# Altium footprint library Connector_PinHeader_2.00mm.PcbLib: 278 footprints (part 14 of 18) (continued)
## PinHeader_2x20_P2.00mm_Horizontal [mm] (continued)
  text "'.Designator'" at 5.006,-22.642 h0.9

## PinHeader_2x20_P2.00mm_Vertical [mm]
pads (40):
  rect 1.35x1.35 hole 0.8: 1(0,0)
  rrect100% 1.35x1.35 hole 0.8: 2(2,0) 3(0,-2) 4(2,-2) 5(0,-4) 6(2,-4) 7(0,-6) 8(2,-6) 9(0,-8) 10(2,-8) 11(0,-10) 12(2,-10) 13(0,-12) 14(2,-12) 15(0,-14) 16(2,-14) 17(0,-16) 18(2,-16) 19(0,-18) 20(2,-18) 21(0,-20) 22(2,-20) 23(0,-22) 24(2,-22) 25(0,-24) 26(2,-24) 27(0,-26) 28(2,-26) 29(0,-28) 30(2,-28) 31(0,-30) 32(2,-30) 33(0,-32) 34(2,-32) 35(0,-34) 36(2,-34) 37(0,-36) 38(2,-36) 39(0,-38) 40(2,-38)
F.SilkS:
  lines w0.12: -1.06,0 -1.06,1.06 0,1.06 ; -1.06,-39.06 3.06,-39.06 3.06,1.06 1,1.06 1,-1 -1.06,-1 -1.06,-39.06
F.CrtYd:
  lines w0.05: -1.5,-39.5 -1.5,1.5 3.5,1.5 3.5,-39.5 -1.5,-39.5
F.Fab:
  lines w0.1: -1,-39 -1,0 0,1 3,1 3,-39 -1,-39
  text "'.Designator'" at 1.84,-23.047 h1

## PinHeader_2x20_P2.00mm_Vertical_SMD [mm]
pads (40):
  rect 2.58x1 smd: 1(-2.085,19) 2(2.085,19) 3(-2.085,17) 4(2.085,17) 5(-2.085,15) 6(2.085,15) 7(-2.085,13) 8(2.085,13) 9(-2.085,11) 10(2.085,11) 11(-2.085,9) 12(2.085,9) 13(-2.085,7) 14(2.085,7) 15(-2.085,5) 16(2.085,5) 17(-2.085,3) 18(2.085,3) 19(-2.085,1) 20(2.085,1) 21(-2.085,-1) 22(2.085,-1) 23(-2.085,-3) 24(2.085,-3) 25(-2.085,-5) 26(2.085,-5) 27(-2.085,-7) 28(2.085,-7) 29(-2.085,-9) 30(2.085,-9) 31(-2.085,-11) 32(2.085,-11) 33(-2.085,-13) 34(2.085,-13) 35(-2.085,-15) 36(2.085,-15) 37(-2.085,-17) 38(2.085,-17) 39(-2.085,-19) 40(2.085,-19)
F.SilkS:
  lines w0.12: -3.315,19.76 -2.06,19.76 -2.06,20.06 2.06,20.06 2.06,19.76 ; -2.06,-19.76 -2.06,-20.06 2.06,-20.06 2.06,-19.76 ; -2.06,-18.24 -2.06,-17.76 ; -2.06,-16.24 -2.06,-15.76 ; -2.06,-14.24 -2.06,-13.76 ; -2.06,-12.24 -2.06,-11.76 ; -2.06,-10.24 -2.06,-9.76 ; -2.06,-8.24 -2.06,-7.76 ; -2.06,-6.24 -2.06,-5.76 ; -2.06,-4.24 -2.06,-3.76 ; -2.06,-2.24 -2.06,-1.76 ; -2.06,-0.24 -2.06,0.24 ; -2.06,1.76 -2.06,2.24 ; -2.06,3.76 -2.06,4.24 ; -2.06,5.76 -2.06,6.24 ; -2.06,7.76 -2.06,8.24 ; -2.06,9.76 -2.06,10.24 ; -2.06,11.76 -2.06,12.24 ; -2.06,13.76 -2.06,14.24 ; -2.06,15.76 -2.06,16.24 ; -2.06,17.76 -2.06,18.24 ; 2.06,-18.24 2.06,-17.76 ; 2.06,-16.24 2.06,-15.76 ; 2.06,-14.24 2.06,-13.76 ; 2.06,-12.24 2.06,-11.76 ; 2.06,-10.24 2.06,-9.76 ; 2.06,-8.24 2.06,-7.76 ; 2.06,-6.24 2.06,-5.76 ; 2.06,-4.24 2.06,-3.76 ; 2.06,-2.24 2.06,-1.76 ; 2.06,-0.24 2.06,0.24 ; 2.06,1.76 2.06,2.24 ; 2.06,3.76 2.06,4.24 ; 2.06,5.76 2.06,6.24 ; 2.06,7.76 2.06,8.24 ; 2.06,9.76 2.06,10.24 ; 2.06,11.76 2.06,12.24 ; 2.06,13.76 2.06,14.24 ; 2.06,15.76 2.06,16.24 ; 2.06,17.76 2.06,18.24
F.CrtYd:
  lines w0.05: -4.9,-20.5 -4.9,20.5 4.9,20.5 4.9,-20.5 -4.9,-20.5
F.Fab:
  lines w0.1: -2,-19.25 -2.875,-19.25 -2.875,-18.75 -2,-18.75 ; -2,-17.25 -2.875,-17.25 -2.875,-16.75 -2,-16.75 ; -2,-15.25 -2.875,-15.25 -2.875,-14.75 -2,-14.75 ; -2,-13.25 -2.875,-13.25 -2.875,-12.75 -2,-12.75 ; -2,-11.25 -2.875,-11.25 -2.875,-10.75 -2,-10.75 ; -2,-9.25 -2.875,-9.25 -2.875,-8.75 -2,-8.75 ; -2,-7.25 -2.875,-7.25 -2.875,-6.75 -2,-6.75 ; -2,-5.25 -2.875,-5.25 -2.875,-4.75 -2,-4.75 ; -2,-3.25 -2.875,-3.25 -2.875,-2.75 -2,-2.75 ; -2,-1.25 -2.875,-1.25 -2.875,-0.75 -2,-0.75 ; -2,0.75 -2.875,0.75 -2.875,1.25 -2,1.25 ; -2,2.75 -2.875,2.75 -2.875,3.25 -2,3.25 ; -2,4.75 -2.875,4.75 -2.875,5.25 -2,5.25 ; -2,6.75 -2.875,6.75 -2.875,7.25 -2,7.25 ; -2,8.75 -2.875,8.75 -2.875,9.25 -2,9.25 ; -2,10.75 -2.875,10.75 -2.875,11.25 -2,11.25 ; -2,12.75 -2.875,12.75 -2.875,13.25 -2,13.25 ; -2,14.75 -2.875,14.75 -2.875,15.25 -2,15.25 ; -2,16.75 -2.875,16.75 -2.875,17.25 -2,17.25 ; -2,18.75 -2.875,18.75 -2.875,19.25 -2,19.25 ; 2,-19.25 2.875,-19.25 2.875,-18.75 2,-18.75 ; 2,-17.25 2.875,-17.25 2.875,-16.75 2,-16.75 ; 2,-15.25 2.875,-15.25 2.875,-14.75 2,-14.75 ; 2,-13.25 2.875,-13.25 2.875,-12.75 2,-12.75 ; 2,-11.25 2.875,-11.25 2.875,-10.75 2,-10.75 ; 2,-9.25 2.875,-9.25 2.875,-8.75 2,-8.75 ; 2,-7.25 2.875,-7.25 2.875,-6.75 2,-6.75 ; 2,-5.25 2.875,-5.25 2.875,-4.75 2,-4.75 ; 2,-3.25 2.875,-3.25 2.875,-2.75 2,-2.75 ; 2,-1.25 2.875,-1.25 2.875,-0.75 2,-0.75 ; 2,0.75 2.875,0.75 2.875,1.25 2,1.25 ; 2,2.75 2.875,2.75 2.875,3.25 2,3.25 ; 2,4.75 2.875,4.75 2.875,5.25 2,5.25 ; 2,6.75 2.875,6.75 2.875,7.25 2,7.25 ; 2,8.75 2.875,8.75 2.875,9.25 2,9.25 ; 2,10.75 2.875,10.75 2.875,11.25 2,11.25 ; 2,12.75 2.875,12.75 2.875,13.25 2,13.25 ; 2,14.75 2.875,14.75 2.875,15.25 2,15.25 ; 2,16.75 2.875,16.75 2.875,17.25 2,17.25 ; 2,18.75 2.875,18.75 2.875,19.25 2,19.25 ; -2,19.25 -2,-20 2,-20 2,20 -1.25,20 -2,19.25
  text "'.Designator'" at 0.84,-4.047 h1

## PinHeader_2x21_P2.00mm_Horizontal [mm]
pads (42):
  rect 1.35x1.35 hole 0.8: 1(0,0)
  rrect100% 1.35x1.35 hole 0.8: 2(2,0) 3(0,-2) 4(2,-2) 5(0,-4) 6(2,-4) 7(0,-6) 8(2,-6) 9(0,-8) 10(2,-8) 11(0,-10) 12(2,-10) 13(0,-12) 14(2,-12) 15(0,-14) 16(2,-14) 17(0,-16) 18(2,-16) 19(0,-18) 20(2,-18) 21(0,-20) 22(2,-20) 23(0,-22) 24(2,-22) 25(0,-24) 26(2,-24) 27(0,-26) 28(2,-26) 29(0,-28) 30(2,-28) 31(0,-30) 32(2,-30) 33(0,-32) 34(2,-32) 35(0,-34) 36(2,-34) 37(0,-36) 38(2,-36) 39(0,-38) 40(2,-38) 41(0,-40) 42(2,-40)
F.SilkS:
  drawing of 178 lines, arcs and shapes, not listed
F.CrtYd:
  lines w0.05: -1.5,-41.5 -1.5,1.5 9.7,1.5 9.7,-41.5 -1.5,-41.5
F.Fab:
  lines w0.1: 3.5,-40.25 -0.25,-40.25 -0.25,-39.75 3.5,-39.75 ; 3.5,-38.25 -0.25,-38.25 -0.25,-37.75 3.5,-37.75 ; 3.5,-36.25 -0.25,-36.25 -0.25,-35.75 3.5,-35.75 ; 3.5,-34.25 -0.25,-34.25 -0.25,-33.75 3.5,-33.75 ; 3.5,-32.25 -0.25,-32.25 -0.25,-31.75 3.5,-31.75 ; 3.5,-30.25 -0.25,-30.25 -0.25,-29.75 3.5,-29.75 ; 3.5,-28.25 -0.25,-28.25 -0.25,-27.75 3.5,-27.75 ; 3.5,-26.25 -0.25,-26.25 -0.25,-25.75 3.5,-25.75 ; 3.5,-24.25 -0.25,-24.25 -0.25,-23.75 3.5,-23.75 ; 3.5,-22.25 -0.25,-22.25 -0.25,-21.75 3.5,-21.75 ; 3.5,-20.25 -0.25,-20.25 -0.25,-19.75 3.5,-19.75 ; 3.5,-18.25 -0.25,-18.25 -0.25,-17.75 3.5,-17.75 ; 3.5,-16.25 -0.25,-16.25 -0.25,-15.75 3.5,-15.75 ; 3.5,-14.25 -0.25,-14.25 -0.25,-13.75 3.5,-13.75 ; 3.5,-12.25 -0.25,-12.25 -0.25,-11.75 3.5,-11.75 ; 3.5,-10.25 -0.25,-10.25 -0.25,-9.75 3.5,-9.75 ; 3.5,-8.25 -0.25,-8.25 -0.25,-7.75 3.5,-7.75 ; 3.5,-6.25 -0.25,-6.25 -0.25,-5.75 3.5,-5.75 ; 3.5,-4.25 -0.25,-4.25 -0.25,-3.75 3.5,-3.75 ; 3.5,-2.25 -0.25,-2.25 -0.25,-1.75 3.5,-1.75 ; 3.5,-0.25 -0.25,-0.25 -0.25,0.25 3.5,0.25 ; 5,-40.25 9.2,-40.25 9.2,-39.75 5,-39.75 ; 5,-38.25 9.2,-38.25 9.2,-37.75 5,-37.75 ; 5,-36.25 9.2,-36.25 9.2,-35.75 5,-35.75 ; 5,-34.25 9.2,-34.25 9.2,-33.75 5,-33.75 ; 5,-32.25 9.2,-32.25 9.2,-31.75 5,-31.75 ; 5,-30.25 9.2,-30.25 9.2,-29.75 5,-29.75 ; 5,-28.25 9.2,-28.25 9.2,-27.75 5,-27.75 ; 5,-26.25 9.2,-26.25 9.2,-25.75 5,-25.75 ; 5,-24.25 9.2,-24.25 9.2,-23.75 5,-23.75 ; 5,-22.25 9.2,-22.25 9.2,-21.75 5,-21.75 ; 5,-20.25 9.2,-20.25 9.2,-19.75 5,-19.75 ; 5,-18.25 9.2,-18.25 9.2,-17.75 5,-17.75 ; 5,-16.25 9.2,-16.25 9.2,-15.75 5,-15.75 ; 5,-14.25 9.2,-14.25 9.2,-13.75 5,-13.75 ; 5,-12.25 9.2,-12.25 9.2,-11.75 5,-11.75 ; 5,-10.25 9.2,-10.25 9.2,-9.75 5,-9.75 ; 5,-8.25 9.2,-8.25 9.2,-7.75 5,-7.75 ; 5,-6.25 9.2,-6.25 9.2,-5.75 5,-5.75 ; 5,-4.25 9.2,-4.25 9.2,-3.75 5,-3.75 ; 5,-2.25 9.2,-2.25 9.2,-1.75 5,-1.75 ; 5,-0.25 9.2,-0.25 9.2,0.25 5,0.25 ; 3.5,-41 3.5,0.625 3.875,1 5,1 5,-41 3.5,-41
  text "'.Designator'" at 5.006,-23.642 h0.9

## PinHeader_2x21_P2.00mm_Vertical [mm]
pads (42):
  rect 1.35x1.35 hole 0.8: 1(0,0)
  rrect100% 1.35x1.35 hole 0.8: 2(2,0) 3(0,-2) 4(2,-2) 5(0,-4) 6(2,-4) 7(0,-6) 8(2,-6) 9(0,-8) 10(2,-8) 11(0,-10) 12(2,-10) 13(0,-12) 14(2,-12) 15(0,-14) 16(2,-14) 17(0,-16) 18(2,-16) 19(0,-18) 20(2,-18) 21(0,-20) 22(2,-20) 23(0,-22) 24(2,-22) 25(0,-24) 26(2,-24) 27(0,-26) 28(2,-26) 29(0,-28) 30(2,-28) 31(0,-30) 32(2,-30) 33(0,-32) 34(2,-32) 35(0,-34) 36(2,-34) 37(0,-36) 38(2,-36) 39(0,-38) 40(2,-38) 41(0,-40) 42(2,-40)
F.SilkS:
  lines w0.12: -1.06,0 -1.06,1.06 0,1.06 ; -1.06,-41.06 -1.06,-1 1,-1 1,1.06 3.06,1.06 3.06,-41.06 -1.06,-41.06
F.CrtYd:
  lines w0.05: -1.5,-41.5 3.5,-41.5 3.5,1.5 -1.5,1.5 -1.5,-41.5
F.Fab:
  lines w0.1: -1,-41 3,-41 3,1 0,1 -1,0 -1,-41
  text "'.Designator'" at 1.84,-24.047 h1

## PinHeader_2x21_P2.00mm_Vertical_SMD [mm]
pads (42):
  rect 2.58x1 smd: 1(-2.085,20) 2(2.085,20) 3(-2.085,18) 4(2.085,18) 5(-2.085,16) 6(2.085,16) 7(-2.085,14) 8(2.085,14) 9(-2.085,12) 10(2.085,12) 11(-2.085,10) 12(2.085,10) 13(-2.085,8) 14(2.085,8) 15(-2.085,6) 16(2.085,6) 17(-2.085,4) 18(2.085,4) 19(-2.085,2) 20(2.085,2) 21(-2.085,0) 22(2.085,0) 23(-2.085,-2) 24(2.085,-2) 25(-2.085,-4) 26(2.085,-4) 27(-2.085,-6) 28(2.085,-6) 29(-2.085,-8) 30(2.085,-8) 31(-2.085,-10) 32(2.085,-10) 33(-2.085,-12) 34(2.085,-12) 35(-2.085,-14) 36(2.085,-14) 37(-2.085,-16) 38(2.085,-16) 39(-2.085,-18) 40(2.085,-18) 41(-2.085,-20) 42(2.085,-20)
F.SilkS:
  lines w0.12: -3.315,20.76 -2.06,20.76 -2.06,21.06 2.06,21.06 2.06,20.76 ; -2.06,-20.76 -2.06,-21.06 2.06,-21.06 2.06,-20.76 ; -2.06,-19.24 -2.06,-18.76 ; -2.06,-17.24 -2.06,-16.76 ; -2.06,-15.24 -2.06,-14.76 ; -2.06,-13.24 -2.06,-12.76 ; -2.06,-11.24 -2.06,-10.76 ; -2.06,-9.24 -2.06,-8.76 ; -2.06,-7.24 -2.06,-6.76 ; -2.06,-5.24 -2.06,-4.76 ; -2.06,-3.24 -2.06,-2.76 ; -2.06,-1.24 -2.06,-0.76 ; -2.06,0.76 -2.06,1.24 ; -2.06,2.76 -2.06,3.24 ; -2.06,4.76 -2.06,5.24 ; -2.06,6.76 -2.06,7.24 ; -2.06,8.76 -2.06,9.24 ; -2.06,10.76 -2.06,11.24 ; -2.06,12.76 -2.06,13.24 ; -2.06,14.76 -2.06,15.24 ; -2.06,16.76 -2.06,17.24 ; -2.06,18.76 -2.06,19.24 ; 2.06,-19.24 2.06,-18.76 ; 2.06,-17.24 2.06,-16.76 ; 2.06,-15.24 2.06,-14.76 ; 2.06,-13.24 2.06,-12.76 ; 2.06,-11.24 2.06,-10.76 ; 2.06,-9.24 2.06,-8.76 ; 2.06,-7.24 2.06,-6.76 ; 2.06,-5.24 2.06,-4.76 ; 2.06,-3.24 2.06,-2.76 ; 2.06,-1.24 2.06,-0.76 ; 2.06,0.76 2.06,1.24 ; 2.06,2.76 2.06,3.24 ; 2.06,4.76 2.06,5.24 ; 2.06,6.76 2.06,7.24 ; 2.06,8.76 2.06,9.24 ; 2.06,10.76 2.06,11.24 ; 2.06,12.76 2.06,13.24 ; 2.06,14.76 2.06,15.24 ; 2.06,16.76 2.06,17.24 ; 2.06,18.76 2.06,19.24
F.CrtYd:
  lines w0.05: -4.9,-21.5 4.9,-21.5 4.9,21.5 -4.9,21.5 -4.9,-21.5
F.Fab:
  lines w0.1: -2,-20.25 -2.875,-20.25 -2.875,-19.75 -2,-19.75 ; -2,-18.25 -2.875,-18.25 -2.875,-17.75 -2,-17.75 ; -2,-16.25 -2.875,-16.25 -2.875,-15.75 -2,-15.75 ; -2,-14.25 -2.875,-14.25 -2.875,-13.75 -2,-13.75 ; -2,-12.25 -2.875,-12.25 -2.875,-11.75 -2,-11.75 ; -2,-10.25 -2.875,-10.25 -2.875,-9.75 -2,-9.75 ; -2,-8.25 -2.875,-8.25 -2.875,-7.75 -2,-7.75 ; -2,-6.25 -2.875,-6.25 -2.875,-5.75 -2,-5.75 ; -2,-4.25 -2.875,-4.25 -2.875,-3.75 -2,-3.75 ; -2,-2.25 -2.875,-2.25 -2.875,-1.75 -2,-1.75 ; -2,-0.25 -2.875,-0.25 -2.875,0.25 -2,0.25 ; -2,1.75 -2.875,1.75 -2.875,2.25 -2,2.25 ; -2,3.75 -2.875,3.75 -2.875,4.25 -2,4.25 ; -2,5.75 -2.875,5.75 -2.875,6.25 -2,6.25 ; -2,7.75 -2.875,7.75 -2.875,8.25 -2,8.25 ; -2,9.75 -2.875,9.75 -2.875,10.25 -2,10.25 ; -2,11.75 -2.875,11.75 -2.875,12.25 -2,12.25 ; -2,13.75 -2.875,13.75 -2.875,14.25 -2,14.25 ; -2,15.75 -2.875,15.75 -2.875,16.25 -2,16.25 ; -2,17.75 -2.875,17.75 -2.875,18.25 -2,18.25 ; -2,19.75 -2.875,19.75 -2.875,20.25 -2,20.25 ; 2,-20.25 2.875,-20.25 2.875,-19.75 2,-19.75 ; 2,-18.25 2.875,-18.25 2.875,-17.75 2,-17.75 ; 2,-16.25 2.875,-16.25 2.875,-15.75 2,-15.75 ; 2,-14.25 2.875,-14.25 2.875,-13.75 2,-13.75 ; 2,-12.25 2.875,-12.25 2.875,-11.75 2,-11.75 ; 2,-10.25 2.875,-10.25 2.875,-9.75 2,-9.75 ; 2,-8.25 2.875,-8.25 2.875,-7.75 2,-7.75 ; 2,-6.25 2.875,-6.25 2.875,-5.75 2,-5.75 ; 2,-4.25 2.875,-4.25 2.875,-3.75 2,-3.75 ; 2,-2.25 2.875,-2.25 2.875,-1.75 2,-1.75 ; 2,-0.25 2.875,-0.25 2.875,0.25 2,0.25 ; 2,1.75 2.875,1.75 2.875,2.25 2,2.25 ; 2,3.75 2.875,3.75 2.875,4.25 2,4.25 ; 2,5.75 2.875,5.75 2.875,6.25 2,6.25 ; 2,7.75 2.875,7.75 2.875,8.25 2,8.25 ; 2,9.75 2.875,9.75 2.875,10.25 2,10.25 ; 2,11.75 2.875,11.75 2.875,12.25 2,12.25 ; 2,13.75 2.875,13.75 2.875,14.25 2,14.25 ; 2,15.75 2.875,15.75 2.875,16.25 2,16.25 ; 2,17.75 2.875,17.75 2.875,18.25 2,18.25 ; 2,19.75 2.875,19.75 2.875,20.25 2,20.25 ; -2,20.25 -1.25,21 2,21 2,-21 -2,-21 -2,20.25
  text "'.Designator'" at 0.84,-4.047 h1

## PinHeader_2x22_P2.00mm_Horizontal [mm]
pads (44):
  rect 1.35x1.35 hole 0.8: 1(0,0)
  rrect100% 1.35x1.35 hole 0.8: 2(2,0) 3(0,-2) 4(2,-2) 5(0,-4) 6(2,-4) 7(0,-6) 8(2,-6) 9(0,-8) 10(2,-8) 11(0,-10) 12(2,-10) 13(0,-12) 14(2,-12) 15(0,-14) 16(2,-14) 17(0,-16) 18(2,-16) 19(0,-18) 20(2,-18) 21(0,-20) 22(2,-20) 23(0,-22) 24(2,-22) 25(0,-24) 26(2,-24) 27(0,-26) 28(2,-26) 29(0,-28) 30(2,-28) 31(0,-30) 32(2,-30) 33(0,-32) 34(2,-32) 35(0,-34) 36(2,-34) 37(0,-36) 38(2,-36) 39(0,-38) 40(2,-38) 41(0,-40) 42(2,-40) 43(0,-42) 44(2,-42)
F.SilkS:
  drawing of 186 lines, arcs and shapes, not listed
F.CrtYd:
  lines w0.05: -1.5,-43.5 9.7,-43.5 9.7,1.5 -1.5,1.5 -1.5,-43.5
F.Fab:
  lines w0.1: 3.5,-42.25 -0.25,-42.25 -0.25,-41.75 3.5,-41.75 ; 3.5,-40.25 -0.25,-40.25 -0.25,-39.75 3.5,-39.75 ; 3.5,-38.25 -0.25,-38.25 -0.25,-37.75 3.5,-37.75 ; 3.5,-36.25 -0.25,-36.25 -0.25,-35.75 3.5,-35.75 ; 3.5,-34.25 -0.25,-34.25 -0.25,-33.75 3.5,-33.75 ; 3.5,-32.25 -0.25,-32.25 -0.25,-31.75 3.5,-31.75 ; 3.5,-30.25 -0.25,-30.25 -0.25,-29.75 3.5,-29.75 ; 3.5,-28.25 -0.25,-28.25 -0.25,-27.75 3.5,-27.75 ; 3.5,-26.25 -0.25,-26.25 -0.25,-25.75 3.5,-25.75 ; 3.5,-24.25 -0.25,-24.25 -0.25,-23.75 3.5,-23.75 ; 3.5,-22.25 -0.25,-22.25 -0.25,-21.75 3.5,-21.75 ; 3.5,-20.25 -0.25,-20.25 -0.25,-19.75 3.5,-19.75 ; 3.5,-18.25 -0.25,-18.25 -0.25,-17.75 3.5,-17.75 ; 3.5,-16.25 -0.25,-16.25 -0.25,-15.75 3.5,-15.75 ; 3.5,-14.25 -0.25,-14.25 -0.25,-13.75 3.5,-13.75 ; 3.5,-12.25 -0.25,-12.25 -0.25,-11.75 3.5,-11.75 ; 3.5,-10.25 -0.25,-10.25 -0.25,-9.75 3.5,-9.75 ; 3.5,-8.25 -0.25,-8.25 -0.25,-7.75 3.5,-7.75 ; 3.5,-6.25 -0.25,-6.25 -0.25,-5.75 3.5,-5.75 ; 3.5,-4.25 -0.25,-4.25 -0.25,-3.75 3.5,-3.75 ; 3.5,-2.25 -0.25,-2.25 -0.25,-1.75 3.5,-1.75 ; 3.5,-0.25 -0.25,-0.25 -0.25,0.25 3.5,0.25 ; 5,-42.25 9.2,-42.25 9.2,-41.75 5,-41.75 ; 5,-40.25 9.2,-40.25 9.2,-39.75 5,-39.75 ; 5,-38.25 9.2,-38.25 9.2,-37.75 5,-37.75 ; 5,-36.25 9.2,-36.25 9.2,-35.75 5,-35.75 ; 5,-34.25 9.2,-34.25 9.2,-33.75 5,-33.75 ; 5,-32.25 9.2,-32.25 9.2,-31.75 5,-31.75 ; 5,-30.25 9.2,-30.25 9.2,-29.75 5,-29.75 ; 5,-28.25 9.2,-28.25 9.2,-27.75 5,-27.75 ; 5,-26.25 9.2,-26.25 9.2,-25.75 5,-25.75 ; 5,-24.25 9.2,-24.25 9.2,-23.75 5,-23.75 ; 5,-22.25 9.2,-22.25 9.2,-21.75 5,-21.75 ; 5,-20.25 9.2,-20.25 9.2,-19.75 5,-19.75 ; 5,-18.25 9.2,-18.25 9.2,-17.75 5,-17.75 ; 5,-16.25 9.2,-16.25 9.2,-15.75 5,-15.75 ; 5,-14.25 9.2,-14.25 9.2,-13.75 5,-13.75 ; 5,-12.25 9.2,-12.25 9.2,-11.75 5,-11.75 ; 5,-10.25 9.2,-10.25 9.2,-9.75 5,-9.75 ; 5,-8.25 9.2,-8.25 9.2,-7.75 5,-7.75 ; 5,-6.25 9.2,-6.25 9.2,-5.75 5,-5.75 ; 5,-4.25 9.2,-4.25 9.2,-3.75 5,-3.75 ; 5,-2.25 9.2,-2.25 9.2,-1.75 5,-1.75 ; 5,-0.25 9.2,-0.25 9.2,0.25 5,0.25 ; 3.5,-43 5,-43 5,1 3.875,1 3.5,0.625 3.5,-43
  text "'.Designator'" at 5.006,-24.642 h0.9

## PinHeader_2x22_P2.00mm_Vertical [mm]
pads (44):
  rect 1.35x1.35 hole 0.8: 1(0,0)
  rrect100% 1.35x1.35 hole 0.8: 2(2,0) 3(0,-2) 4(2,-2) 5(0,-4) 6(2,-4) 7(0,-6) 8(2,-6) 9(0,-8) 10(2,-8) 11(0,-10) 12(2,-10) 13(0,-12) 14(2,-12) 15(0,-14) 16(2,-14) 17(0,-16) 18(2,-16) 19(0,-18) 20(2,-18) 21(0,-20) 22(2,-20) 23(0,-22) 24(2,-22) 25(0,-24) 26(2,-24) 27(0,-26) 28(2,-26) 29(0,-28) 30(2,-28) 31(0,-30) 32(2,-30) 33(0,-32) 34(2,-32) 35(0,-34) 36(2,-34) 37(0,-36) 38(2,-36) 39(0,-38) 40(2,-38) 41(0,-40) 42(2,-40) 43(0,-42) 44(2,-42)
F.SilkS:
  lines w0.12: -1.06,0 -1.06,1.06 0,1.06 ; -1.06,-43.06 3.06,-43.06 3.06,1.06 1,1.06 1,-1 -1.06,-1 -1.06,-43.06
F.CrtYd:
  lines w0.05: -1.5,-43.5 -1.5,1.5 3.5,1.5 3.5,-43.5 -1.5,-43.5
F.Fab:
  lines w0.1: -1,-43 -1,0 0,1 3,1 3,-43 -1,-43
  text "'.Designator'" at 1.84,-25.047 h1

## PinHeader_2x22_P2.00mm_Vertical_SMD [mm]
pads (44):
  rect 2.58x1 smd: 1(-2.085,21) 2(2.085,21) 3(-2.085,19) 4(2.085,19) 5(-2.085,17) 6(2.085,17) 7(-2.085,15) 8(2.085,15) 9(-2.085,13) 10(2.085,13) 11(-2.085,11) 12(2.085,11) 13(-2.085,9) 14(2.085,9) 15(-2.085,7) 16(2.085,7) 17(-2.085,5) 18(2.085,5) 19(-2.085,3) 20(2.085,3) 21(-2.085,1) 22(2.085,1) 23(-2.085,-1) 24(2.085,-1) 25(-2.085,-3) 26(2.085,-3) 27(-2.085,-5) 28(2.085,-5) 29(-2.085,-7) 30(2.085,-7) 31(-2.085,-9) 32(2.085,-9) 33(-2.085,-11) 34(2.085,-11) 35(-2.085,-13) 36(2.085,-13) 37(-2.085,-15) 38(2.085,-15) 39(-2.085,-17) 40(2.085,-17) 41(-2.085,-19) 42(2.085,-19) 43(-2.085,-21) 44(2.085,-21)
F.SilkS:
  lines w0.12: -3.315,21.76 -2.06,21.76 -2.06,22.06 2.06,22.06 2.06,21.76 ; -2.06,-21.76 -2.06,-22.06 2.06,-22.06 2.06,-21.76 ; -2.06,-20.24 -2.06,-19.76 ; -2.06,-18.24 -2.06,-17.76 ; -2.06,-16.24 -2.06,-15.76 ; -2.06,-14.24 -2.06,-13.76 ; -2.06,-12.24 -2.06,-11.76 ; -2.06,-10.24 -2.06,-9.76 ; -2.06,-8.24 -2.06,-7.76 ; -2.06,-6.24 -2.06,-5.76 ; -2.06,-4.24 -2.06,-3.76 ; -2.06,-2.24 -2.06,-1.76 ; -2.06,-0.24 -2.06,0.24 ; -2.06,1.76 -2.06,2.24 ; -2.06,3.76 -2.06,4.24 ; -2.06,5.76 -2.06,6.24 ; -2.06,7.76 -2.06,8.24 ; -2.06,9.76 -2.06,10.24 ; -2.06,11.76 -2.06,12.24 ; -2.06,13.76 -2.06,14.24 ; -2.06,15.76 -2.06,16.24 ; -2.06,17.76 -2.06,18.24 ; -2.06,19.76 -2.06,20.24 ; 2.06,-20.24 2.06,-19.76 ; 2.06,-18.24 2.06,-17.76 ; 2.06,-16.24 2.06,-15.76 ; 2.06,-14.24 2.06,-13.76 ; 2.06,-12.24 2.06,-11.76 ; 2.06,-10.24 2.06,-9.76 ; 2.06,-8.24 2.06,-7.76 ; 2.06,-6.24 2.06,-5.76 ; 2.06,-4.24 2.06,-3.76 ; 2.06,-2.24 2.06,-1.76 ; 2.06,-0.24 2.06,0.24 ; 2.06,1.76 2.06,2.24 ; 2.06,3.76 2.06,4.24 ; 2.06,5.76 2.06,6.24 ; 2.06,7.76 2.06,8.24 ; 2.06,9.76 2.06,10.24 ; 2.06,11.76 2.06,12.24 ; 2.06,13.76 2.06,14.24 ; 2.06,15.76 2.06,16.24 ; 2.06,17.76 2.06,18.24 ; 2.06,19.76 2.06,20.24
F.CrtYd:
  lines w0.05: -4.9,-22.5 -4.9,22.5 4.9,22.5 4.9,-22.5 -4.9,-22.5
F.Fab:
  lines w0.1: -2,-21.25 -2.875,-21.25 -2.875,-20.75 -2,-20.75 ; -2,-19.25 -2.875,-19.25 -2.875,-18.75 -2,-18.75 ; -2,-17.25 -2.875,-17.25 -2.875,-16.75 -2,-16.75 ; -2,-15.25 -2.875,-15.25 -2.875,-14.75 -2,-14.75 ; -2,-13.25 -2.875,-13.25 -2.875,-12.75 -2,-12.75 ; -2,-11.25 -2.875,-11.25 -2.875,-10.75 -2,-10.75 ; -2,-9.25 -2.875,-9.25 -2.875,-8.75 -2,-8.75 ; -2,-7.25 -2.875,-7.25 -2.875,-6.75 -2,-6.75 ; -2,-5.25 -2.875,-5.25 -2.875,-4.75 -2,-4.75 ; -2,-3.25 -2.875,-3.25 -2.875,-2.75 -2,-2.75 ; -2,-1.25 -2.875,-1.25 -2.875,-0.75 -2,-0.75 ; -2,0.75 -2.875,0.75 -2.875,1.25 -2,1.25 ; -2,2.75 -2.875,2.75 -2.875,3.25 -2,3.25 ; -2,4.75 -2.875,4.75 -2.875,5.25 -2,5.25 ; -2,6.75 -2.875,6.75 -2.875,7.25 -2,7.25 ; -2,8.75 -2.875,8.75 -2.875,9.25 -2,9.25 ; -2,10.75 -2.875,10.75 -2.875,11.25 -2,11.25 ; -2,12.75 -2.875,12.75 -2.875,13.25 -2,13.25 ; -2,14.75 -2.875,14.75 -2.875,15.25 -2,15.25 ; -2,16.75 -2.875,16.75 -2.875,17.25 -2,17.25 ; -2,18.75 -2.875,18.75 -2.875,19.25 -2,19.25 ; -2,20.75 -2.875,20.75 -2.875,21.25 -2,21.25 ; 2,-21.25 2.875,-21.25 2.875,-20.75 2,-20.75 ; 2,-19.25 2.875,-19.25 2.875,-18.75 2,-18.75 ; 2,-17.25 2.875,-17.25 2.875,-16.75 2,-16.75 ; 2,-15.25 2.875,-15.25 2.875,-14.75 2,-14.75 ; 2,-13.25 2.875,-13.25 2.875,-12.75 2,-12.75 ; 2,-11.25 2.875,-11.25 2.875,-10.75 2,-10.75 ; 2,-9.25 2.875,-9.25 2.875,-8.75 2,-8.75 ; 2,-7.25 2.875,-7.25 2.875,-6.75 2,-6.75 ; 2,-5.25 2.875,-5.25 2.875,-4.75 2,-4.75 ; 2,-3.25 2.875,-3.25 2.875,-2.75 2,-2.75 ; 2,-1.25 2.875,-1.25 2.875,-0.75 2,-0.75 ; 2,0.75 2.875,0.75 2.875,1.25 2,1.25 ; 2,2.75 2.875,2.75 2.875,3.25 2,3.25 ; 2,4.75 2.875,4.75 2.875,5.25 2,5.25 ; 2,6.75 2.875,6.75 2.875,7.25 2,7.25 ; 2,8.75 2.875,8.75 2.875,9.25 2,9.25 ; 2,10.75 2.875,10.75 2.875,11.25 2,11.25 ; 2,12.75 2.875,12.75 2.875,13.25 2,13.25 ; 2,14.75 2.875,14.75 2.875,15.25 2,15.25 ; 2,16.75 2.875,16.75 2.875,17.25 2,17.25 ; 2,18.75 2.875,18.75 2.875,19.25 2,19.25 ; 2,20.75 2.875,20.75 2.875,21.25 2,21.25 ; -2,21.25 -2,-22 2,-22 2,22 -1.25,22 -2,21.25
  text "'.Designator'" at 0.84,-4.047 h1